# Altium footprint library MYLIB.PcbLib: 600 footprints (part 26 of 39)
Each footprint in its own frame and in the unit in brackets; x right, y up, seen from the top. Pads: shape width x height; smd on the part's side, far side on the other; paste and mask are expansions set on the pad; w line width, h text height; cw(c..) or ccw(c..) is an arc to the next point about the centre after c.
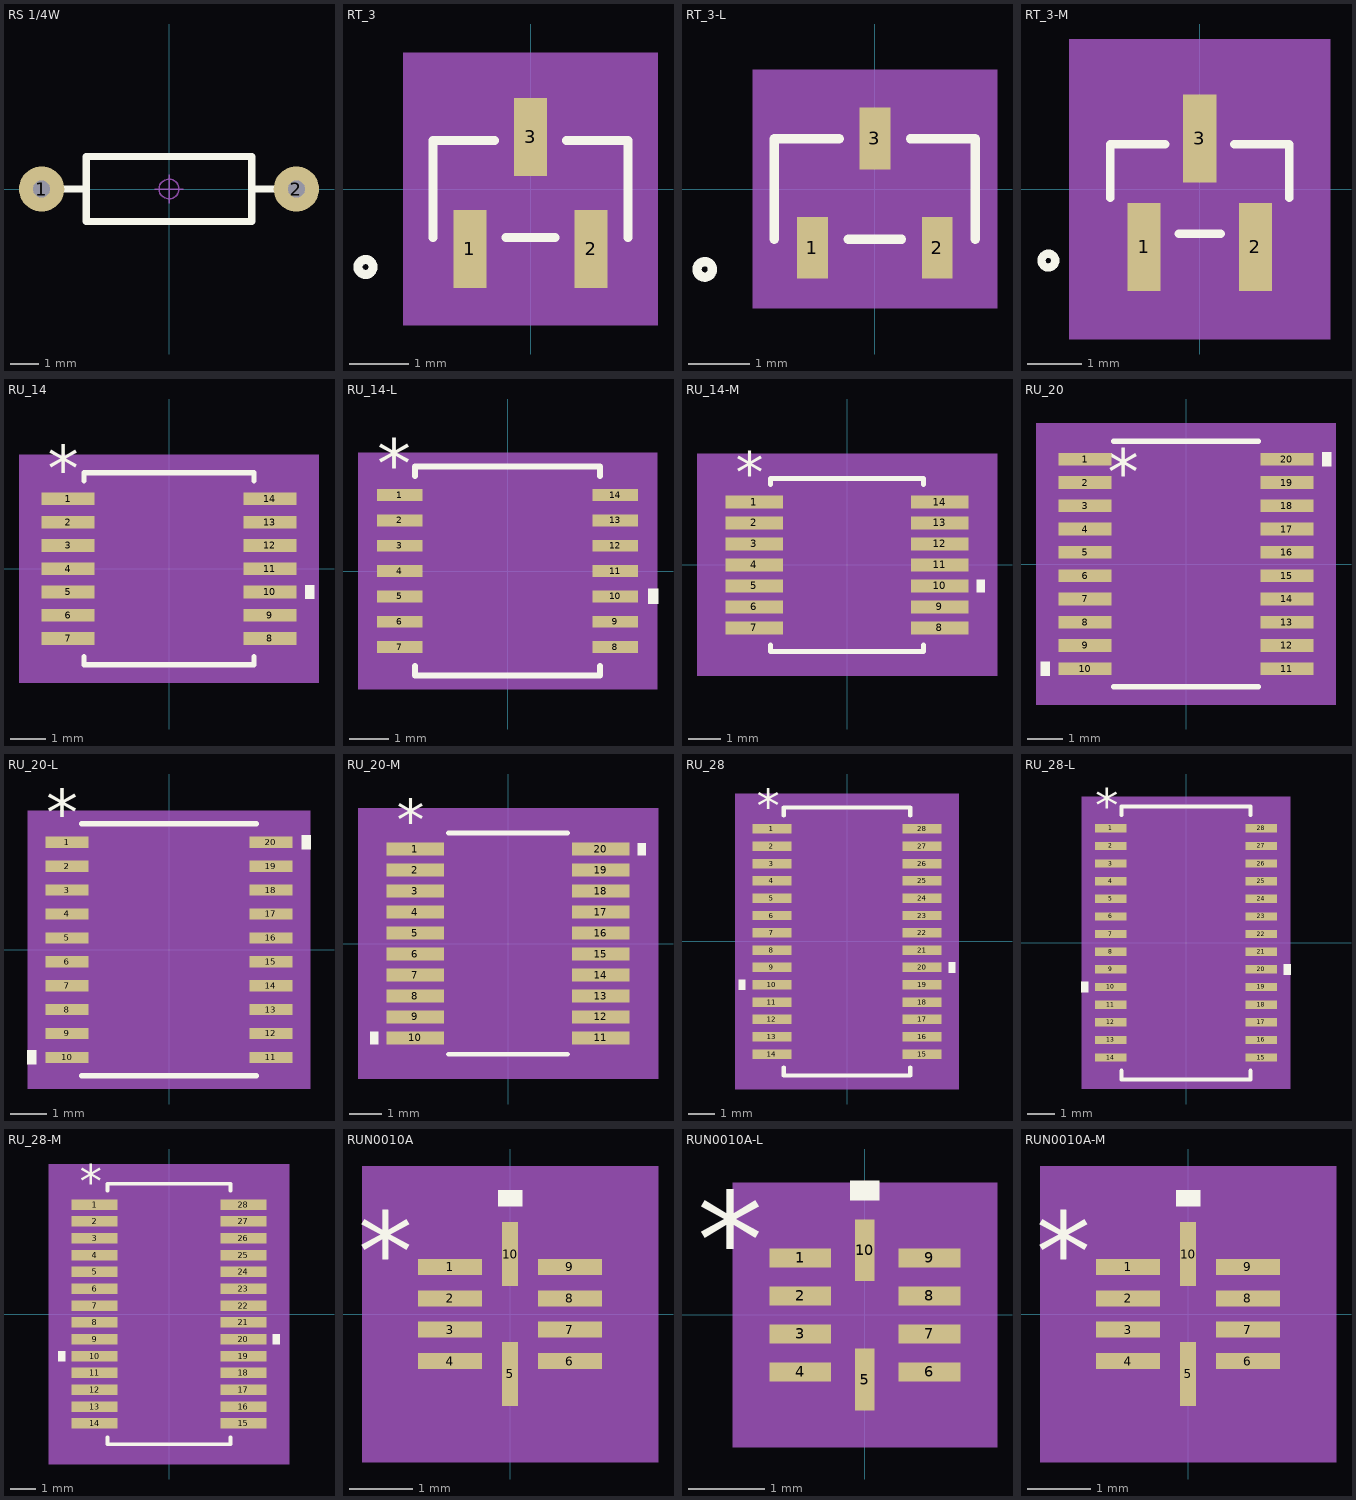
[diagram p25: the footprints below, top view; thin cyan lines are the x and y axes]

## RS 1/4W [mm] "直插色环电阻，脚距9mm，直径2.3mm"
pads (2):
  round 1.6 hole 0.6: 1(-4.5,0) 2(4.5,0)
Top Overlay:
  lines w0.254: -3.683,0 -3.048,0 ; 3.048,0 3.683,0 ; -2.921,-1.143 2.921,-1.143 2.921,1.143 -2.921,1.143 -2.921,-1.143
Mechanical 15:
  circle w0.05: c0,0 r0.35
  lines w0.05: -0.5,0 0.5,0 ; 0,-0.5 0,0.5
3D body "RS 1-4W.STEP": height 2.32, standoff -3.49, extent -4.725,-1.16 4.725,1.16

## RT_3 [mil]
pads (3):
  rect 22x52 smd paste+5.25 mask+5: 1(-40.35,-40) 2(40.35,-40) 3(0,34.75)
Top Overlay:
  circle w6: c-110,-52 r5
  lines w6: -65,-32.5 -65,32.5 -24.1,32.5 ; -16.25,-32.5 16.25,-32.5 ; 24.1,32.5 65,32.5 65,-32.5
Mechanical 5:
  region: -85,91 85,91 85,-91 -85,-91
Mechanical 13:
  circle w0: c-50,-17.5 r5
  lines w1: -60,-27.5 60,-27.5 60,27.5 -60,27.5 -60,-27.5 ; -50.35,-52 -50.35,-27.5 -30.35,-27.5 -30.35,-52 -50.35,-52 ; -10,27.5 10,27.5 10,52 -10,52 -10,27.5 ; 30.35,-52 30.35,-27.5 50.35,-27.5 50.35,-52 30.35,-52
Mechanical 15:
  region: -70,-37.5 -70,37.5 -21,37.5 -21,76 21,76 21,37.5 70,37.5 70,-37.5 61.35,-37.5 61.35,-76 -61.35,-76 -61.35,-37.5
  region: 60,-27.5 -60,-27.5 -60,27.5 60,27.5
  lines w6: -70,-37.5 -70,37.5 -21,37.5 -21,76 21,76 21,37.5 70,37.5 70,-37.5 61.35,-37.5 61.35,-76 -61.35,-76 -61.35,-37.5 -70,-37.5
3D body: height 10, standoff 0, extent 0,0 10,10

## RT_3-L [mil]
pads (3):
  rect 20x40 smd paste+5.25 mask+5: 1(-40.35,-38) 2(40.35,-38) 3(0,32.75)
Top Overlay:
  circle w6: c-110,-52 r5
  lines w6: -65,-32.5 -65,32.5 -23.1,32.5 ; -17.25,-32.5 17.25,-32.5 ; 23.1,32.5 65,32.5 65,-32.5
Mechanical 5:
  region: -79,77 79,77 79,-77 -79,-77
Mechanical 13:
  circle w0: c-50,-17.5 r5
  lines w1: -60,-27.5 60,-27.5 60,27.5 -60,27.5 -60,-27.5 ; -50.35,-52 -50.35,-27.5 -30.35,-27.5 -30.35,-52 -50.35,-52 ; -10,27.5 10,27.5 10,52 -10,52 -10,27.5 ; 30.35,-52 30.35,-27.5 50.35,-27.5 50.35,-52 30.35,-52
Mechanical 15:
  region: -64,-31.5 -64,31.5 -14,31.5 -14,62 14,62 14,31.5 64,31.5 64,-31.5 54.35,-31.5 54.35,-62 -54.35,-62 -54.35,-31.5
  region: 60,-27.5 -60,-27.5 -60,27.5 60,27.5
  lines w6: -64,-31.5 -64,31.5 -14,31.5 -14,62 14,62 14,31.5 64,31.5 64,-31.5 54.35,-31.5 54.35,-62 -54.35,-62 -54.35,-31.5 -64,-31.5
3D body: height 10, standoff 0, extent 0,0 10,10

## RT_3-M [mil]
pads (3):
  rect 24x64 smd paste+5.25 mask+5: 1(-40.35,-42) 2(40.35,-42) 3(0,36.75)
Top Overlay:
  circle w6: c-110,-52 r5
  lines w6: -65,-6.58 -65,32.5 -25.1,32.5 ; -15.25,-32.5 15.25,-32.5 ; 25.1,32.5 65,32.5 65,-6.58
Mechanical 5:
  region: -95,109 95,109 95,-109 -95,-109
Mechanical 13:
  circle w0: c-50,-17.5 r5
  lines w1: -60,-27.5 60,-27.5 60,27.5 -60,27.5 -60,-27.5 ; -50.35,-52 -50.35,-27.5 -30.35,-27.5 -30.35,-52 -50.35,-52 ; -10,27.5 10,27.5 10,52 -10,52 -10,27.5 ; 30.35,-52 30.35,-27.5 50.35,-27.5 50.35,-52 30.35,-52
Mechanical 15:
  region: -80,-47.5 -80,47.5 -32,47.5 -32,94 32,94 32,47.5 80,47.5 80,-47.5 72.35,-47.5 72.35,-94 -72.35,-94 -72.35,-47.5
  region: 60,-27.5 -60,-27.5 -60,27.5 60,27.5
  lines w6: -80,-47.5 -80,47.5 -32,47.5 -32,94 32,94 32,47.5 80,47.5 80,-47.5 72.35,-47.5 72.35,-94 -72.35,-94 -72.35,-47.5 -80,-47.5
3D body: height 10, standoff 0, extent 0,0 10,10

## RU_14 [mil]
pads (14):
  rect 58x14 smd paste+0 mask+0: 1(-111,76.77) 2(-111,51.18) 3(-111,25.59) 4(-111,0) 5(-111,-25.59) 6(-111,-51.18) 7(-111,-76.77) 8(111,-76.77) 9(111,-51.18) 10(111,-25.59) 11(111,0) 12(111,25.59) 13(111,51.18) 14(111,76.77)
Top Overlay:
  region: 150,-18.09 160,-18.09 160,-33.09 150,-33.09
  lines w6: -93.5,-96.87 -93.5,-105.5 93.5,-105.5 93.5,-96.87 ; -93.5,96.87 -93.5,105.5 93.5,105.5 93.5,96.87
  text "*" at -133.5,85.77 h50
Mechanical 5:
  region: 165,-125.5 -165,-125.5 -165,125.5 165,125.5
Mechanical 13:
  lines w0: -12,100.5 ccw(c0,100.5) 12,100.5
  lines w1: -126,-82.77 -126,-70.77 -88.5,-70.77 -88.5,-82.77 -126,-82.77 ; -126,-57.18 -126,-45.18 -88.5,-45.18 -88.5,-57.18 -126,-57.18 ; -126,-31.59 -126,-19.59 -88.5,-19.59 -88.5,-31.59 -126,-31.59 ; -126,-6 -126,6 -88.5,6 -88.5,-6 -126,-6 ; -126,19.59 -126,31.59 -88.5,31.59 -88.5,19.59 -126,19.59 ; -126,45.18 -126,57.18 -88.5,57.18 -88.5,45.18 -126,45.18 ; -126,70.77 -126,82.77 -88.5,82.77 -88.5,70.77 -126,70.77 ; -88.5,-100.5 88.5,-100.5 88.5,100.5 -88.5,100.5 -88.5,-100.5 ; 88.5,-82.77 88.5,-70.77 126,-70.77 126,-82.77 88.5,-82.77 ; 88.5,-57.18 88.5,-45.18 126,-45.18 126,-57.18 88.5,-57.18 ; 88.5,-31.59 88.5,-19.59 126,-19.59 126,-31.59 88.5,-31.59 ; 88.5,-6 88.5,6 126,6 126,-6 88.5,-6 ; 88.5,19.59 88.5,31.59 126,31.59 126,19.59 88.5,19.59 ; 88.5,45.18 88.5,57.18 126,57.18 126,45.18 88.5,45.18 ; 88.5,70.77 88.5,82.77 126,82.77 126,70.77 88.5,70.77
  text "*" at -86,47.5 h50
Mechanical 15:
  region: -98.5,-93.77 -150,-93.77 -150,93.77 -98.5,93.77 -98.5,110.5 98.5,110.5 98.5,93.77 150,93.77 150,-93.77 98.5,-93.77 98.5,-110.5 -98.5,-110.5
  lines w6: -150,-93.77 -150,93.77 -98.5,93.77 -98.5,110.5 98.5,110.5 98.5,93.77 150,93.77 150,-93.77 98.5,-93.77 98.5,-110.5 -98.5,-110.5 -98.5,-93.77 -150,-93.77
3D body: height 10, standoff 0, extent 0,0 10,10

## RU_14-L [mil]
pads (14):
  rect 46x12 smd paste+0 mask+0: 1(-109,76.77) 2(-109,51.18) 3(-109,25.59) 4(-109,0) 5(-109,-25.59) 6(-109,-51.18) 7(-109,-76.77) 8(109,-76.77) 9(109,-51.18) 10(109,-25.59) 11(109,0) 12(109,25.59) 13(109,51.18) 14(109,76.77)
Top Overlay:
  region: 142,-18.09 152,-18.09 152,-33.09 142,-33.09
  lines w6: -93.5,-95.87 -93.5,-105.5 93.5,-105.5 93.5,-95.87 ; -93.5,95.87 -93.5,105.5 93.5,105.5 93.5,95.87
  text "*" at -131.5,83.77 h50
Mechanical 5:
  region: 151,-119.5 -151,-119.5 -151,119.5 151,119.5
Mechanical 13:
  lines w0: -12,100.5 ccw(c0,100.5) 12,100.5
  lines w1: -126,-82.77 -88.5,-82.77 -88.5,-70.77 -126,-70.77 -126,-82.77 ; -126,-57.18 -88.5,-57.18 -88.5,-45.18 -126,-45.18 -126,-57.18 ; -126,-31.59 -88.5,-31.59 -88.5,-19.59 -126,-19.59 -126,-31.59 ; -126,-6 -88.5,-6 -88.5,6 -126,6 -126,-6 ; -126,19.59 -88.5,19.59 -88.5,31.59 -126,31.59 -126,19.59 ; -126,45.18 -88.5,45.18 -88.5,57.18 -126,57.18 -126,45.18 ; -126,70.77 -88.5,70.77 -88.5,82.77 -126,82.77 -126,70.77 ; -88.5,-100.5 -88.5,100.5 88.5,100.5 88.5,-100.5 -88.5,-100.5 ; 88.5,-82.77 126,-82.77 126,-70.77 88.5,-70.77 88.5,-82.77 ; 88.5,-57.18 126,-57.18 126,-45.18 88.5,-45.18 88.5,-57.18 ; 88.5,-31.59 126,-31.59 126,-19.59 88.5,-19.59 88.5,-31.59 ; 88.5,-6 126,-6 126,6 88.5,6 88.5,-6 ; 88.5,19.59 126,19.59 126,31.59 88.5,31.59 88.5,19.59 ; 88.5,45.18 126,45.18 126,57.18 88.5,57.18 88.5,45.18 ; 88.5,70.77 126,70.77 126,82.77 88.5,82.77 88.5,70.77
  text "*" at -86,47.5 h50
Mechanical 15:
  region: -92.5,-86.77 -136,-86.77 -136,86.77 -92.5,86.77 -92.5,104.5 92.5,104.5 92.5,86.77 136,86.77 136,-86.77 92.5,-86.77 92.5,-104.5 -92.5,-104.5
  lines w6: -136,-86.77 -92.5,-86.77 -92.5,-104.5 92.5,-104.5 92.5,-86.77 136,-86.77 136,86.77 92.5,86.77 92.5,104.5 -92.5,104.5 -92.5,86.77 -136,86.77 -136,-86.77
3D body: height 10, standoff 0, extent 0,0 10,10

## RU_14-M [mil]
pads (14):
  rect 70x16 smd paste+0 mask+0: 1(-113,76.77) 2(-113,51.18) 3(-113,25.59) 4(-113,0) 5(-113,-25.59) 6(-113,-51.18) 7(-113,-76.77) 8(113,-76.77) 9(113,-51.18) 10(113,-25.59) 11(113,0) 12(113,25.59) 13(113,51.18) 14(113,76.77)
Top Overlay:
  region: 158,-18.09 168,-18.09 168,-33.09 158,-33.09
  lines w6: -93.5,-97.87 -93.5,-105.5 93.5,-105.5 93.5,-97.87 ; -93.5,97.87 -93.5,105.5 93.5,105.5 93.5,97.87
  text "*" at -135.5,87.77 h50
Mechanical 5:
  region: 183,-135.5 -183,-135.5 -183,135.5 183,135.5
Mechanical 13:
  lines w0: -12,100.5 ccw(c0,100.5) 12,100.5
  lines w1: -126,-82.77 -126,-70.77 -88.5,-70.77 -88.5,-82.77 -126,-82.77 ; -126,-57.18 -126,-45.18 -88.5,-45.18 -88.5,-57.18 -126,-57.18 ; -126,-31.59 -126,-19.59 -88.5,-19.59 -88.5,-31.59 -126,-31.59 ; -126,-6 -126,6 -88.5,6 -88.5,-6 -126,-6 ; -126,19.59 -126,31.59 -88.5,31.59 -88.5,19.59 -126,19.59 ; -126,45.18 -126,57.18 -88.5,57.18 -88.5,45.18 -126,45.18 ; -126,70.77 -126,82.77 -88.5,82.77 -88.5,70.77 -126,70.77 ; -88.5,-100.5 88.5,-100.5 88.5,100.5 -88.5,100.5 -88.5,-100.5 ; 88.5,-82.77 88.5,-70.77 126,-70.77 126,-82.77 88.5,-82.77 ; 88.5,-57.18 88.5,-45.18 126,-45.18 126,-57.18 88.5,-57.18 ; 88.5,-31.59 88.5,-19.59 126,-19.59 126,-31.59 88.5,-31.59 ; 88.5,-6 88.5,6 126,6 126,-6 88.5,-6 ; 88.5,19.59 88.5,31.59 126,31.59 126,19.59 88.5,19.59 ; 88.5,45.18 88.5,57.18 126,57.18 126,45.18 88.5,45.18 ; 88.5,70.77 88.5,82.77 126,82.77 126,70.77 88.5,70.77
  text "*" at -86,47.5 h50
Mechanical 15:
  region: -108.5,-104.77 -168,-104.77 -168,104.77 -108.5,104.77 -108.5,120.5 108.5,120.5 108.5,104.77 168,104.77 168,-104.77 108.5,-104.77 108.5,-120.5 -108.5,-120.5
  lines w6: -168,-104.77 -168,104.77 -108.5,104.77 -108.5,120.5 108.5,120.5 108.5,104.77 168,104.77 168,-104.77 108.5,-104.77 108.5,-120.5 -108.5,-120.5 -108.5,-104.77 -168,-104.77
3D body: height 10, standoff 0, extent 0,0 10,10

## RU_20 [mil]
pads (20):
  rect 58x14 smd: 1(-111,115.16) 2(-111,89.57) 3(-111,63.98) 4(-111,38.39) 5(-111,12.8) 6(-111,-12.8) 7(-111,-38.39) 8(-111,-63.98) 9(-111,-89.57) 10(-111,-115.16) 11(111,-115.16) 12(111,-89.57) 13(111,-63.98) 14(111,-38.39) 15(111,-12.8) 16(111,12.8) 17(111,38.39) 18(111,63.98) 19(111,89.57) 20(111,115.16)
Top Overlay:
  region: 150,122.66 160,122.66 160,107.66 150,107.66
  region: -150,-107.66 -160,-107.66 -160,-122.66 -150,-122.66
  lines w6: -79.42,-135 79.42,-135 ; -79.42,135 79.42,135
  text "*" at -86,77 h50
Mechanical 5:
  region: 165,-155 -165,-155 -165,155 165,155
Mechanical 13:
  lines w0: -12,130 ccw(c0,130) 12,130
  lines w1: -126,-121.16 -88.5,-121.16 -88.5,-109.16 -126,-109.16 -126,-121.16 ; -126,-95.57 -88.5,-95.57 -88.5,-83.57 -126,-83.57 -126,-95.57 ; -126,-69.98 -88.5,-69.98 -88.5,-57.98 -126,-57.98 -126,-69.98 ; -126,-44.39 -88.5,-44.39 -88.5,-32.39 -126,-32.39 -126,-44.39 ; -126,-18.8 -88.5,-18.8 -88.5,-6.8 -126,-6.8 -126,-18.8 ; -126,6.8 -88.5,6.8 -88.5,18.8 -126,18.8 -126,6.8 ; -126,32.39 -88.5,32.39 -88.5,44.39 -126,44.39 -126,32.39 ; -126,57.98 -88.5,57.98 -88.5,69.98 -126,69.98 -126,57.98 ; -126,83.57 -88.5,83.57 -88.5,95.57 -126,95.57 -126,83.57 ; -126,109.16 -88.5,109.16 -88.5,121.16 -126,121.16 -126,109.16 ; -88.5,-130 -88.5,130 88.5,130 88.5,-130 -88.5,-130 ; 88.5,-121.16 126,-121.16 126,-109.16 88.5,-109.16 88.5,-121.16 ; 88.5,-95.57 126,-95.57 126,-83.57 88.5,-83.57 88.5,-95.57 ; 88.5,-69.98 126,-69.98 126,-57.98 88.5,-57.98 88.5,-69.98 ; 88.5,-44.39 126,-44.39 126,-32.39 88.5,-32.39 88.5,-44.39 ; 88.5,-18.8 126,-18.8 126,-6.8 88.5,-6.8 88.5,-18.8 ; 88.5,6.8 126,6.8 126,18.8 88.5,18.8 88.5,6.8 ; 88.5,32.39 126,32.39 126,44.39 88.5,44.39 88.5,32.39 ; 88.5,57.98 126,57.98 126,69.98 88.5,69.98 88.5,57.98 ; 88.5,83.57 126,83.57 126,95.57 88.5,95.57 88.5,83.57 ; 88.5,109.16 126,109.16 126,121.16 88.5,121.16 88.5,109.16
  text "*" at -86,77 h50
Mechanical 15:
  region: -98.5,-129.95 -150,-129.95 -150,129.95 -98.5,129.95 -98.5,140 98.5,140 98.5,129.95 150,129.95 150,-129.95 98.5,-129.95 98.5,-140 -98.5,-140
  lines w6: -150,-129.95 -98.5,-129.95 -98.5,-140 98.5,-140 98.5,-129.95 150,-129.95 150,129.95 98.5,129.95 98.5,140 -98.5,140 -98.5,129.95 -150,129.95 -150,-129.95
3D body: height 10, standoff 0, extent 0,0 10,10

## RU_20-L [mil]
pads (20):
  rect 46x12 smd paste+0 mask+0: 1(-109,115.16) 2(-109,89.57) 3(-109,63.98) 4(-109,38.39) 5(-109,12.8) 6(-109,-12.8) 7(-109,-38.39) 8(-109,-63.98) 9(-109,-89.57) 10(-109,-115.16) 11(109,-115.16) 12(109,-89.57) 13(109,-63.98) 14(109,-38.39) 15(109,-12.8) 16(109,12.8) 17(109,38.39) 18(109,63.98) 19(109,89.57) 20(109,115.16)
Top Overlay:
  region: 142,122.66 152,122.66 152,107.66 142,107.66
  region: -142,-107.66 -152,-107.66 -152,-122.66 -142,-122.66
  lines w6: -93.5,-135 93.5,-135 ; -93.5,135 93.5,135
  text "*" at -131.5,122.16 h50
Mechanical 5:
  region: 151,-149 -151,-149 -151,149 151,149
Mechanical 13:
  lines w0: -12,130 ccw(c0,130) 12,130
  lines w1: -126,-121.16 -88.5,-121.16 -88.5,-109.16 -126,-109.16 -126,-121.16 ; -126,-95.57 -88.5,-95.57 -88.5,-83.57 -126,-83.57 -126,-95.57 ; -126,-69.98 -88.5,-69.98 -88.5,-57.98 -126,-57.98 -126,-69.98 ; -126,-44.39 -88.5,-44.39 -88.5,-32.39 -126,-32.39 -126,-44.39 ; -126,-18.8 -88.5,-18.8 -88.5,-6.8 -126,-6.8 -126,-18.8 ; -126,6.8 -88.5,6.8 -88.5,18.8 -126,18.8 -126,6.8 ; -126,32.39 -88.5,32.39 -88.5,44.39 -126,44.39 -126,32.39 ; -126,57.98 -88.5,57.98 -88.5,69.98 -126,69.98 -126,57.98 ; -126,83.57 -88.5,83.57 -88.5,95.57 -126,95.57 -126,83.57 ; -126,109.16 -88.5,109.16 -88.5,121.16 -126,121.16 -126,109.16 ; -88.5,-130 -88.5,130 88.5,130 88.5,-130 -88.5,-130 ; 88.5,-121.16 126,-121.16 126,-109.16 88.5,-109.16 88.5,-121.16 ; 88.5,-95.57 126,-95.57 126,-83.57 88.5,-83.57 88.5,-95.57 ; 88.5,-69.98 126,-69.98 126,-57.98 88.5,-57.98 88.5,-69.98 ; 88.5,-44.39 126,-44.39 126,-32.39 88.5,-32.39 88.5,-44.39 ; 88.5,-18.8 126,-18.8 126,-6.8 88.5,-6.8 88.5,-18.8 ; 88.5,6.8 126,6.8 126,18.8 88.5,18.8 88.5,6.8 ; 88.5,32.39 126,32.39 126,44.39 88.5,44.39 88.5,32.39 ; 88.5,57.98 126,57.98 126,69.98 88.5,69.98 88.5,57.98 ; 88.5,83.57 126,83.57 126,95.57 88.5,95.57 88.5,83.57 ; 88.5,109.16 126,109.16 126,121.16 88.5,121.16 88.5,109.16
  text "*" at -86,77 h50
Mechanical 15:
  region: -92.5,-125.16 -136,-125.16 -136,125.16 -92.5,125.16 -92.5,134 92.5,134 92.5,125.16 136,125.16 136,-125.16 92.5,-125.16 92.5,-134 -92.5,-134
  lines w6: -136,-125.16 -92.5,-125.16 -92.5,-134 92.5,-134 92.5,-125.16 136,-125.16 136,125.16 92.5,125.16 92.5,134 -92.5,134 -92.5,125.16 -136,125.16 -136,-125.16
3D body: height 10, standoff 0, extent 0,0 10,10

## RU_20-M [mil]
pads (20):
  rect 70x16 smd paste+0 mask+0: 1(-113,115.16) 2(-113,89.57) 3(-113,63.98) 4(-113,38.39) 5(-113,12.8) 6(-113,-12.8) 7(-113,-38.39) 8(-113,-63.98) 9(-113,-89.57) 10(-113,-115.16) 11(113,-115.16) 12(113,-89.57) 13(113,-63.98) 14(113,-38.39) 15(113,-12.8) 16(113,12.8) 17(113,38.39) 18(113,63.98) 19(113,89.57) 20(113,115.16)
Top Overlay:
  region: -158,-107.66 -168,-107.66 -168,-122.66 -158,-122.66
  region: 158,122.66 168,122.66 168,107.66 158,107.66
  lines w6: -72.4,-135 72.4,-135 ; -72.4,135 72.4,135
  text "*" at -135.5,126.16 h50
Mechanical 5:
  region: 183,-165 -183,-165 -183,165 183,165
Mechanical 13:
  lines w0: -12,130 ccw(c0,130) 12,130
  lines w1: -126,-121.16 -126,-109.16 -88.5,-109.16 -88.5,-121.16 -126,-121.16 ; -126,-95.57 -126,-83.57 -88.5,-83.57 -88.5,-95.57 -126,-95.57 ; -126,-69.98 -126,-57.98 -88.5,-57.98 -88.5,-69.98 -126,-69.98 ; -126,-44.39 -126,-32.39 -88.5,-32.39 -88.5,-44.39 -126,-44.39 ; -126,-18.8 -126,-6.8 -88.5,-6.8 -88.5,-18.8 -126,-18.8 ; -126,6.8 -126,18.8 -88.5,18.8 -88.5,6.8 -126,6.8 ; -126,32.39 -126,44.39 -88.5,44.39 -88.5,32.39 -126,32.39 ; -126,57.98 -126,69.98 -88.5,69.98 -88.5,57.98 -126,57.98 ; -126,83.57 -126,95.57 -88.5,95.57 -88.5,83.57 -126,83.57 ; -126,109.16 -126,121.16 -88.5,121.16 -88.5,109.16 -126,109.16 ; -88.5,-130 88.5,-130 88.5,130 -88.5,130 -88.5,-130 ; 88.5,-121.16 88.5,-109.16 126,-109.16 126,-121.16 88.5,-121.16 ; 88.5,-95.57 88.5,-83.57 126,-83.57 126,-95.57 88.5,-95.57 ; 88.5,-69.98 88.5,-57.98 126,-57.98 126,-69.98 88.5,-69.98 ; 88.5,-44.39 88.5,-32.39 126,-32.39 126,-44.39 88.5,-44.39 ; 88.5,-18.8 88.5,-6.8 126,-6.8 126,-18.8 88.5,-18.8 ; 88.5,6.8 88.5,18.8 126,18.8 126,6.8 88.5,6.8 ; 88.5,32.39 88.5,44.39 126,44.39 126,32.39 88.5,32.39 ; 88.5,57.98 88.5,69.98 126,69.98 126,57.98 88.5,57.98 ; 88.5,83.57 88.5,95.57 126,95.57 126,83.57 88.5,83.57 ; 88.5,109.16 88.5,121.16 126,121.16 126,109.16 88.5,109.16
  text "*" at -86,77 h50
Mechanical 15:
  region: -108.5,-143.16 -168,-143.16 -168,143.16 -108.5,143.16 -108.5,150 108.5,150 108.5,143.16 168,143.16 168,-143.16 108.5,-143.16 108.5,-150 -108.5,-150
  lines w6: -168,-143.16 -168,143.16 -108.5,143.16 -108.5,150 108.5,150 108.5,143.16 168,143.16 168,-143.16 108.5,-143.16 108.5,-150 -108.5,-150 -108.5,-143.16 -168,-143.16
3D body: height 10, standoff 0, extent 0,0 10,10

## RU_28 [mil]
pads (28):
  rect 58x14 smd paste+0 mask+0: 1(-111,166.34) 2(-111,140.75) 3(-111,115.16) 4(-111,89.57) 5(-111,63.98) 6(-111,38.39) 7(-111,12.8) 8(-111,-12.8) 9(-111,-38.39) 10(-111,-63.98) 11(-111,-89.57) 12(-111,-115.16) 13(-111,-140.75) 14(-111,-166.34) 15(111,-166.34) 16(111,-140.75) 17(111,-115.16) 18(111,-89.57) 19(111,-63.98) 20(111,-38.39) 21(111,-12.8) 22(111,12.8) 23(111,38.39) 24(111,63.98) 25(111,89.57) 26(111,115.16) 27(111,140.75) 28(111,166.34)
Top Overlay:
  region: -150,-56.48 -160,-56.48 -160,-71.48 -150,-71.48
  region: 150,-30.89 160,-30.89 160,-45.89 150,-45.89
  lines w6: -93.5,-186.44 -93.5,-198 93.5,-198 93.5,-186.44 ; -93.5,186.44 -93.5,198 93.5,198 93.5,186.44
  text "*" at -133.5,175.34 h50
Mechanical 5:
  region: 165,-218 -165,-218 -165,218 165,218
Mechanical 13:
  lines w0: -12,193 ccw(c0,193) 12,193
  lines w1: -126,-172.34 -126,-160.34 -88.5,-160.34 -88.5,-172.34 -126,-172.34 ; -126,-146.75 -126,-134.75 -88.5,-134.75 -88.5,-146.75 -126,-146.75 ; -126,-121.16 -126,-109.16 -88.5,-109.16 -88.5,-121.16 -126,-121.16 ; -126,-95.57 -126,-83.57 -88.5,-83.57 -88.5,-95.57 -126,-95.57 ; -126,-69.98 -126,-57.98 -88.5,-57.98 -88.5,-69.98 -126,-69.98 ; -126,-44.39 -126,-32.39 -88.5,-32.39 -88.5,-44.39 -126,-44.39 ; -126,-18.8 -126,-6.8 -88.5,-6.8 -88.5,-18.8 -126,-18.8 ; -126,6.8 -126,18.8 -88.5,18.8 -88.5,6.8 -126,6.8 ; -126,32.39 -126,44.39 -88.5,44.39 -88.5,32.39 -126,32.39 ; -126,57.98 -126,69.98 -88.5,69.98 -88.5,57.98 -126,57.98 ; -126,83.57 -126,95.57 -88.5,95.57 -88.5,83.57 -126,83.57 ; -126,109.16 -126,121.16 -88.5,121.16 -88.5,109.16 -126,109.16 ; -126,134.75 -126,146.75 -88.5,146.75 -88.5,134.75 -126,134.75 ; -126,160.34 -126,172.34 -88.5,172.34 -88.5,160.34 -126,160.34 ; -88.5,-193 88.5,-193 88.5,193 -88.5,193 -88.5,-193 ; 88.5,-172.34 88.5,-160.34 126,-160.34 126,-172.34 88.5,-172.34 ; 88.5,-146.75 88.5,-134.75 126,-134.75 126,-146.75 88.5,-146.75 ; 88.5,-121.16 88.5,-109.16 126,-109.16 126,-121.16 88.5,-121.16 ; 88.5,-95.57 88.5,-83.57 126,-83.57 126,-95.57 88.5,-95.57 ; 88.5,-69.98 88.5,-57.98 126,-57.98 126,-69.98 88.5,-69.98 ; 88.5,-44.39 88.5,-32.39 126,-32.39 126,-44.39 88.5,-44.39 ; 88.5,-18.8 88.5,-6.8 126,-6.8 126,-18.8 88.5,-18.8 ; 88.5,6.8 88.5,18.8 126,18.8 126,6.8 88.5,6.8 ; 88.5,32.39 88.5,44.39 126,44.39 126,32.39 88.5,32.39 ; 88.5,57.98 88.5,69.98 126,69.98 126,57.98 88.5,57.98 ; 88.5,83.57 88.5,95.57 126,95.57 126,83.57 88.5,83.57 ; 88.5,109.16 88.5,121.16 126,121.16 126,109.16 88.5,109.16 ; 88.5,134.75 88.5,146.75 126,146.75 126,134.75 88.5,134.75 ; 88.5,160.34 88.5,172.34 126,172.34 126,160.34 88.5,160.34
  text "*" at -86,140 h50
Mechanical 15:
  region: -98.5,-183.34 -150,-183.34 -150,183.34 -98.5,183.34 -98.5,203 98.5,203 98.5,183.34 150,183.34 150,-183.34 98.5,-183.34 98.5,-203 -98.5,-203
  lines w6: -150,-183.34 -150,183.34 -98.5,183.34 -98.5,203 98.5,203 98.5,183.34 150,183.34 150,-183.34 98.5,-183.34 98.5,-203 -98.5,-203 -98.5,-183.34 -150,-183.34
3D body: height 10, standoff 0, extent 0,0 10,10

## RU_28-L [mil]
pads (28):
  rect 46x12 smd paste+0 mask+0: 1(-109,166.34) 2(-109,140.75) 3(-109,115.16) 4(-109,89.57) 5(-109,63.98) 6(-109,38.39) 7(-109,12.8) 8(-109,-12.8) 9(-109,-38.39) 10(-109,-63.98) 11(-109,-89.57) 12(-109,-115.16) 13(-109,-140.75) 14(-109,-166.34) 15(109,-166.34) 16(109,-140.75) 17(109,-115.16) 18(109,-89.57) 19(109,-63.98) 20(109,-38.39) 21(109,-12.8) 22(109,12.8) 23(109,38.39) 24(109,63.98) 25(109,89.57) 26(109,115.16) 27(109,140.75) 28(109,166.34)
Top Overlay:
  region: 142,-30.89 152,-30.89 152,-45.89 142,-45.89
  region: -142,-56.48 -152,-56.48 -152,-71.48 -142,-71.48
  lines w6: -93.5,-185.44 -93.5,-198 93.5,-198 93.5,-185.44 ; -93.5,185.44 -93.5,198 93.5,198 93.5,185.44
  text "*" at -131.5,173.34 h50
Mechanical 5:
  region: 151,-212 -151,-212 -151,212 151,212
Mechanical 13:
  lines w0: -12,193 ccw(c0,193) 12,193
  lines w1: -126,-172.34 -88.5,-172.34 -88.5,-160.34 -126,-160.34 -126,-172.34 ; -126,-146.75 -88.5,-146.75 -88.5,-134.75 -126,-134.75 -126,-146.75 ; -126,-121.16 -88.5,-121.16 -88.5,-109.16 -126,-109.16 -126,-121.16 ; -126,-95.57 -88.5,-95.57 -88.5,-83.57 -126,-83.57 -126,-95.57 ; -126,-69.98 -88.5,-69.98 -88.5,-57.98 -126,-57.98 -126,-69.98 ; -126,-44.39 -88.5,-44.39 -88.5,-32.39 -126,-32.39 -126,-44.39 ; -126,-18.8 -88.5,-18.8 -88.5,-6.8 -126,-6.8 -126,-18.8 ; -126,6.8 -88.5,6.8 -88.5,18.8 -126,18.8 -126,6.8 ; -126,32.39 -88.5,32.39 -88.5,44.39 -126,44.39 -126,32.39 ; -126,57.98 -88.5,57.98 -88.5,69.98 -126,69.98 -126,57.98 ; -126,83.57 -88.5,83.57 -88.5,95.57 -126,95.57 -126,83.57 ; -126,109.16 -88.5,109.16 -88.5,121.16 -126,121.16 -126,109.16 ; -126,134.75 -88.5,134.75 -88.5,146.75 -126,146.75 -126,134.75 ; -126,160.34 -88.5,160.34 -88.5,172.34 -126,172.34 -126,160.34 ; -88.5,-193 -88.5,193 88.5,193 88.5,-193 -88.5,-193 ; 88.5,-172.34 126,-172.34 126,-160.34 88.5,-160.34 88.5,-172.34 ; 88.5,-146.75 126,-146.75 126,-134.75 88.5,-134.75 88.5,-146.75 ; 88.5,-121.16 126,-121.16 126,-109.16 88.5,-109.16 88.5,-121.16 ; 88.5,-95.57 126,-95.57 126,-83.57 88.5,-83.57 88.5,-95.57 ; 88.5,-69.98 126,-69.98 126,-57.98 88.5,-57.98 88.5,-69.98 ; 88.5,-44.39 126,-44.39 126,-32.39 88.5,-32.39 88.5,-44.39 ; 88.5,-18.8 126,-18.8 126,-6.8 88.5,-6.8 88.5,-18.8 ; 88.5,6.8 126,6.8 126,18.8 88.5,18.8 88.5,6.8 ; 88.5,32.39 126,32.39 126,44.39 88.5,44.39 88.5,32.39 ; 88.5,57.98 126,57.98 126,69.98 88.5,69.98 88.5,57.98 ; 88.5,83.57 126,83.57 126,95.57 88.5,95.57 88.5,83.57 ; 88.5,109.16 126,109.16 126,121.16 88.5,121.16 88.5,109.16 ; 88.5,134.75 126,134.75 126,146.75 88.5,146.75 88.5,134.75 ; 88.5,160.34 126,160.34 126,172.34 88.5,172.34 88.5,160.34
  text "*" at -86,140 h50
Mechanical 15:
  region: -92.5,-176.34 -136,-176.34 -136,176.34 -92.5,176.34 -92.5,197 92.5,197 92.5,176.34 136,176.34 136,-176.34 92.5,-176.34 92.5,-197 -92.5,-197
  lines w6: -136,-176.34 -92.5,-176.34 -92.5,-197 92.5,-197 92.5,-176.34 136,-176.34 136,176.34 92.5,176.34 92.5,197 -92.5,197 -92.5,176.34 -136,176.34 -136,-176.34
3D body: height 10, standoff 0, extent 0,0 10,10

## RU_28-M [mil]
pads (28):
  rect 70x16 smd paste+0 mask+0: 1(-113,166.34) 2(-113,140.75) 3(-113,115.16) 4(-113,89.57) 5(-113,63.98) 6(-113,38.39) 7(-113,12.8) 8(-113,-12.8) 9(-113,-38.39) 10(-113,-63.98) 11(-113,-89.57) 12(-113,-115.16) 13(-113,-140.75) 14(-113,-166.34) 15(113,-166.34) 16(113,-140.75) 17(113,-115.16) 18(113,-89.57) 19(113,-63.98) 20(113,-38.39) 21(113,-12.8) 22(113,12.8) 23(113,38.39) 24(113,63.98) 25(113,89.57) 26(113,115.16) 27(113,140.75) 28(113,166.34)
Top Overlay:
  region: 158,-30.89 168,-30.89 168,-45.89 158,-45.89
  region: -158,-56.48 -168,-56.48 -168,-71.48 -158,-71.48
  lines w6: -93.5,-187.44 -93.5,-198 93.5,-198 93.5,-187.44 ; -93.5,187.44 -93.5,198 93.5,198 93.5,187.44
  text "*" at -135.5,177.34 h50
Mechanical 5:
  region: 183,-228 -183,-228 -183,228 183,228
Mechanical 13:
  lines w0: -12,193 ccw(c0,193) 12,193
  lines w1: -126,-172.34 -88.5,-172.34 -88.5,-160.34 -126,-160.34 -126,-172.34 ; -126,-146.75 -88.5,-146.75 -88.5,-134.75 -126,-134.75 -126,-146.75 ; -126,-121.16 -88.5,-121.16 -88.5,-109.16 -126,-109.16 -126,-121.16 ; -126,-95.57 -88.5,-95.57 -88.5,-83.57 -126,-83.57 -126,-95.57 ; -126,-69.98 -88.5,-69.98 -88.5,-57.98 -126,-57.98 -126,-69.98 ; -126,-44.39 -88.5,-44.39 -88.5,-32.39 -126,-32.39 -126,-44.39 ; -126,-18.8 -88.5,-18.8 -88.5,-6.8 -126,-6.8 -126,-18.8 ; -126,6.8 -88.5,6.8 -88.5,18.8 -126,18.8 -126,6.8 ; -126,32.39 -88.5,32.39 -88.5,44.39 -126,44.39 -126,32.39 ; -126,57.98 -88.5,57.98 -88.5,69.98 -126,69.98 -126,57.98 ; -126,83.57 -88.5,83.57 -88.5,95.57 -126,95.57 -126,83.57 ; -126,109.16 -88.5,109.16 -88.5,121.16 -126,121.16 -126,109.16 ; -126,134.75 -88.5,134.75 -88.5,146.75 -126,146.75 -126,134.75 ; -126,160.34 -88.5,160.34 -88.5,172.34 -126,172.34 -126,160.34 ; -88.5,-193 -88.5,193 88.5,193 88.5,-193 -88.5,-193 ; 88.5,-172.34 126,-172.34 126,-160.34 88.5,-160.34 88.5,-172.34 ; 88.5,-146.75 126,-146.75 126,-134.75 88.5,-134.75 88.5,-146.75 ; 88.5,-121.16 126,-121.16 126,-109.16 88.5,-109.16 88.5,-121.16 ; 88.5,-95.57 126,-95.57 126,-83.57 88.5,-83.57 88.5,-95.57 ; 88.5,-69.98 126,-69.98 126,-57.98 88.5,-57.98 88.5,-69.98 ; 88.5,-44.39 126,-44.39 126,-32.39 88.5,-32.39 88.5,-44.39 ; 88.5,-18.8 126,-18.8 126,-6.8 88.5,-6.8 88.5,-18.8 ; 88.5,6.8 126,6.8 126,18.8 88.5,18.8 88.5,6.8 ; 88.5,32.39 126,32.39 126,44.39 88.5,44.39 88.5,32.39 ; 88.5,57.98 126,57.98 126,69.98 88.5,69.98 88.5,57.98 ; 88.5,83.57 126,83.57 126,95.57 88.5,95.57 88.5,83.57 ; 88.5,109.16 126,109.16 126,121.16 88.5,121.16 88.5,109.16 ; 88.5,134.75 126,134.75 126,146.75 88.5,146.75 88.5,134.75 ; 88.5,160.34 126,160.34 126,172.34 88.5,172.34 88.5,160.34
  text "*" at -86,140 h50
Mechanical 15:
  region: -108.5,-194.34 -168,-194.34 -168,194.34 -108.5,194.34 -108.5,213 108.5,213 108.5,194.34 168,194.34 168,-194.34 108.5,-194.34 108.5,-213 -108.5,-213
  lines w6: -168,-194.34 -108.5,-194.34 -108.5,-213 108.5,-213 108.5,-194.34 168,-194.34 168,194.34 108.5,194.34 108.5,213 -108.5,213 -108.5,194.34 -168,194.34 -168,-194.34
3D body: height 10, standoff 0, extent 0,0 10,10

## RUN0010A [mil]
pads (10):
  rect 40x10 smd paste+0 mask+0: 1(-37.5,29.53) 2(-37.5,9.84) 3(-37.5,-9.84) 4(-37.5,-29.53) 6(37.5,-29.53) 7(37.5,-9.84) 8(37.5,9.84) 9(37.5,29.53)
  rect 10x40 smd paste+0 mask+0: 5(0,-37.5) 10(0,37.5)
Top Overlay:
  region: 7.5,67.5 -7.5,67.5 -7.5,77.5 7.5,77.5
  text "*" at -95,14.37 h50
Mechanical 5:
  region: 92.5,-92.5 -92.5,-92.5 -92.5,92.5 92.5,92.5
Mechanical 13:
  lines w1: -39.5,-10.5 10.5,39.5 ; -41.5,-35.53 -41.5,-23.53 -39.5,-23.53 -39.5,-35.53 -41.5,-35.53 ; -41.5,-15.84 -41.5,-3.84 -39.5,-3.84 -39.5,-15.84 -41.5,-15.84 ; -41.5,3.84 -41.5,15.84 -39.5,15.84 -39.5,3.84 -41.5,3.84 ; -41.5,23.53 -41.5,35.53 -39.5,35.53 -39.5,23.53 -41.5,23.53 ; -39.5,-39.5 39.5,-39.5 39.5,39.5 -39.5,39.5 -39.5,-39.5 ; -6,-41.5 -6,-39.5 6,-39.5 6,-41.5 -6,-41.5 ; -6,39.5 6,39.5 6,41.5 -6,41.5 -6,39.5 ; 39.5,-35.53 39.5,-23.53 41.5,-23.53 41.5,-35.53 39.5,-35.53 ; 39.5,-15.84 39.5,-3.84 41.5,-3.84 41.5,-15.84 39.5,-15.84 ; 39.5,3.84 39.5,15.84 41.5,15.84 41.5,3.84 39.5,3.84 ; 39.5,23.53 39.5,35.53 41.5,35.53 41.5,23.53 39.5,23.53
  text "*" at -30,14.37 h50
Mechanical 15:
  region: -25,-59.5 -59.5,-59.5 -59.5,-54.53 -77.5,-54.53 -77.5,54.53 -59.5,54.53 -59.5,59.5 -25,59.5 -25,77.5 25,77.5 25,59.5 59.5,59.5 59.5,54.53 77.5,54.53 77.5,-54.53 59.5,-54.53 59.5,-59.5 25,-59.5 25,-77.5 -25,-77.5
  lines w6: -77.5,-54.53 -59.5,-54.53 -59.5,-59.5 -25,-59.5 -25,-77.5 25,-77.5 25,-59.5 59.5,-59.5 59.5,-54.53 77.5,-54.53 77.5,54.53 59.5,54.53 59.5,59.5 25,59.5 25,77.5 -25,77.5 -25,59.5 -59.5,59.5 -59.5,54.53 -77.5,54.53 -77.5,-54.53
3D body: height 10, standoff 0, extent 0,0 10,10

## RUN0010A-L [mil]
pads (10):
  rect 32x10 smd paste+0 mask+0: 1(-33.5,29.53) 2(-33.5,9.84) 3(-33.5,-9.84) 4(-33.5,-29.53) 6(33.5,-29.53) 7(33.5,-9.84) 8(33.5,9.84) 9(33.5,29.53)
  rect 10x32 smd paste+0 mask+0: 5(0,-33.5) 10(0,33.5)
Top Overlay:
  region: 7.5,59.5 -7.5,59.5 -7.5,69.5 7.5,69.5
  text "*" at -87,14.37 h50
Mechanical 5:
  region: 68.5,-68.5 -68.5,-68.5 -68.5,68.5 68.5,68.5
Mechanical 13:
  lines w1: -39.5,-10.5 10.5,39.5 ; -41.5,-35.53 -39.5,-35.53 -39.5,-23.53 -41.5,-23.53 -41.5,-35.53 ; -41.5,-15.84 -39.5,-15.84 -39.5,-3.84 -41.5,-3.84 -41.5,-15.84 ; -41.5,3.84 -39.5,3.84 -39.5,15.84 -41.5,15.84 -41.5,3.84 ; -41.5,23.53 -39.5,23.53 -39.5,35.53 -41.5,35.53 -41.5,23.53 ; -39.5,-39.5 -39.5,39.5 39.5,39.5 39.5,-39.5 -39.5,-39.5 ; -6,-41.5 6,-41.5 6,-39.5 -6,-39.5 -6,-41.5 ; -6,39.5 -6,41.5 6,41.5 6,39.5 -6,39.5 ; 39.5,-35.53 41.5,-35.53 41.5,-23.53 39.5,-23.53 39.5,-35.53 ; 39.5,-15.84 41.5,-15.84 41.5,-3.84 39.5,-3.84 39.5,-15.84 ; 39.5,3.84 41.5,3.84 41.5,15.84 39.5,15.84 39.5,3.84 ; 39.5,23.53 41.5,23.53 41.5,35.53 39.5,35.53 39.5,23.53
  text "*" at -30,14.37 h50
Mechanical 15:
  region: -9,-43.5 -43.5,-43.5 -43.5,-38.53 -53.5,-38.53 -53.5,38.53 -43.5,38.53 -43.5,43.5 -9,43.5 -9,53.5 9,53.5 9,43.5 43.5,43.5 43.5,38.53 53.5,38.53 53.5,-38.53 43.5,-38.53 43.5,-43.5 9,-43.5 9,-53.5 -9,-53.5
  lines w6: -53.5,-38.53 -53.5,38.53 -43.5,38.53 -43.5,43.5 -9,43.5 -9,53.5 9,53.5 9,43.5 43.5,43.5 43.5,38.53 53.5,38.53 53.5,-38.53 43.5,-38.53 43.5,-43.5 9,-43.5 9,-53.5 -9,-53.5 -9,-43.5 -43.5,-43.5 -43.5,-38.53 -53.5,-38.53
3D body: height 10, standoff 0, extent 0,0 10,10

## RUN0010A-M [mil]
pads (10):
  rect 40x10 smd paste+0 mask+0: 1(-37.5,29.53) 2(-37.5,9.84) 3(-37.5,-9.84) 4(-37.5,-29.53) 6(37.5,-29.53) 7(37.5,-9.84) 8(37.5,9.84) 9(37.5,29.53)
  rect 10x40 smd paste+0 mask+0: 5(0,-37.5) 10(0,37.5)
Top Overlay:
  region: 7.5,67.5 -7.5,67.5 -7.5,77.5 7.5,77.5
  text "*" at -95,14.37 h50
Mechanical 5:
  region: 92.5,-92.5 -92.5,-92.5 -92.5,92.5 92.5,92.5
Mechanical 13:
  lines w1: -39.5,-10.5 10.5,39.5 ; -41.5,-35.53 -39.5,-35.53 -39.5,-23.53 -41.5,-23.53 -41.5,-35.53 ; -41.5,-15.84 -39.5,-15.84 -39.5,-3.84 -41.5,-3.84 -41.5,-15.84 ; -41.5,3.84 -39.5,3.84 -39.5,15.84 -41.5,15.84 -41.5,3.84 ; -41.5,23.53 -39.5,23.53 -39.5,35.53 -41.5,35.53 -41.5,23.53 ; -39.5,-39.5 -39.5,39.5 39.5,39.5 39.5,-39.5 -39.5,-39.5 ; -6,-41.5 6,-41.5 6,-39.5 -6,-39.5 -6,-41.5 ; -6,39.5 -6,41.5 6,41.5 6,39.5 -6,39.5 ; 39.5,-35.53 41.5,-35.53 41.5,-23.53 39.5,-23.53 39.5,-35.53 ; 39.5,-15.84 41.5,-15.84 41.5,-3.84 39.5,-3.84 39.5,-15.84 ; 39.5,3.84 41.5,3.84 41.5,15.84 39.5,15.84 39.5,3.84 ; 39.5,23.53 41.5,23.53 41.5,35.53 39.5,35.53 39.5,23.53
  text "*" at -30,14.37 h50
Mechanical 15:
  region: -25,-59.5 -59.5,-59.5 -59.5,-54.53 -77.5,-54.53 -77.5,54.53 -59.5,54.53 -59.5,59.5 -25,59.5 -25,77.5 25,77.5 25,59.5 59.5,59.5 59.5,54.53 77.5,54.53 77.5,-54.53 59.5,-54.53 59.5,-59.5 25,-59.5 25,-77.5 -25,-77.5
  lines w6: -77.5,-54.53 -77.5,54.53 -59.5,54.53 -59.5,59.5 -25,59.5 -25,77.5 25,77.5 25,59.5 59.5,59.5 59.5,54.53 77.5,54.53 77.5,-54.53 59.5,-54.53 59.5,-59.5 25,-59.5 25,-77.5 -25,-77.5 -25,-59.5 -59.5,-59.5 -59.5,-54.53 -77.5,-54.53
3D body: height 10, standoff 0, extent 0,0 10,10